# Altium footprint library Connectors.PcbLib: 218 footprints (part 10 of 14)
Each footprint in its own frame and in the unit in brackets; x right, y up, seen from the top. Pads: shape width x height; smd on the part's side, far side on the other; paste and mask are expansions set on the pad; w line width, h text height; cw(c..) or ccw(c..) is an arc to the next point about the centre after c.
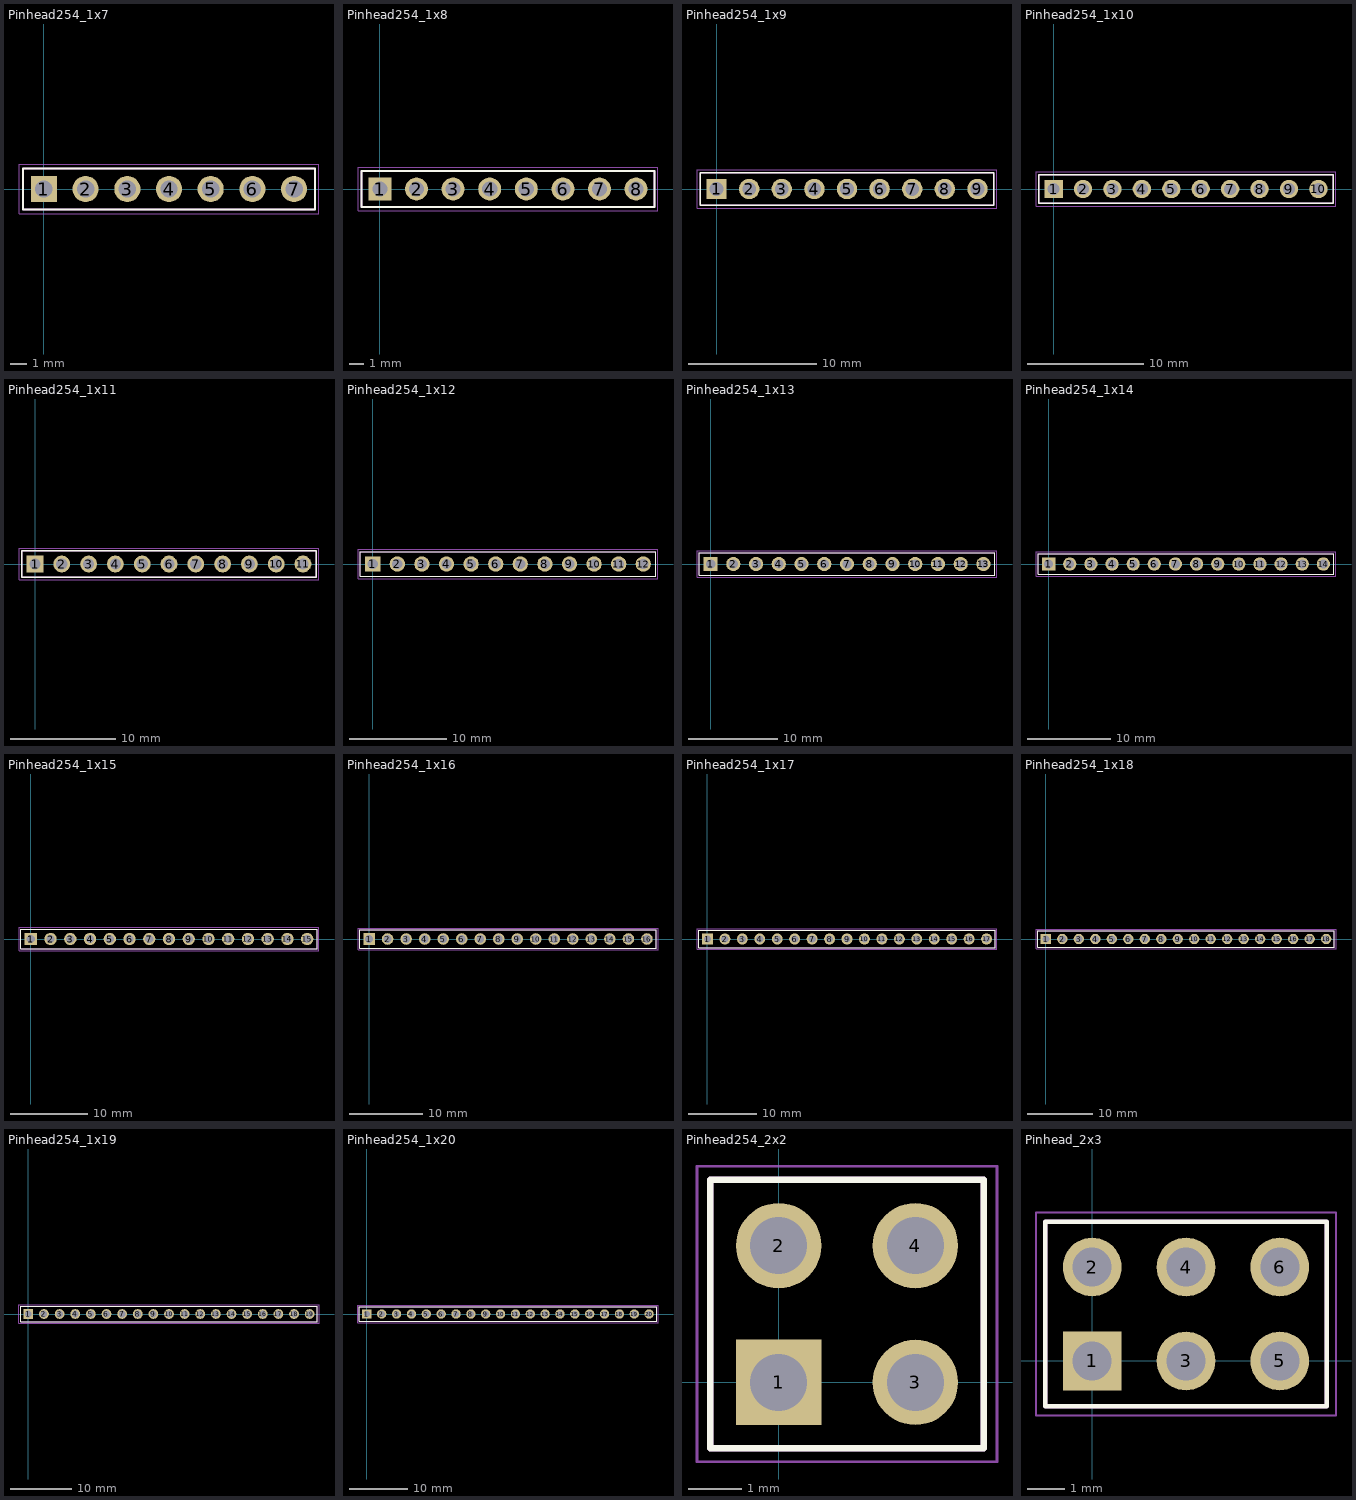
[diagram p9: the footprints below, top view; thin cyan lines are the x and y axes]

## Pinhead254_1x7 [mm]
height 8.79
pads (7):
  rect 1.59x1.59 hole 1.06: 1(0,0)
  round 1.59 hole 1.06: 2(2.54,0) 3(5.08,0) 4(7.62,0) 5(10.16,0) 6(12.7,0) 7(15.24,0)
Top Overlay:
  lines w0.12: -1.27,-1.25 -1.27,1.25 16.51,1.25 16.51,-1.25 -1.27,-1.25
Mechanical 8:
  lines w0.12: -1.27,-1.25 -1.27,1.25 16.51,1.25 16.51,-1.25 -1.27,-1.25
Mechanical 13:
  lines w0.025: -1.27,-1.25 -1.27,1.25 16.51,1.25 16.51,-1.25 -1.27,-1.25 ; -0.32,-0.32 -0.32,0.32 0.32,0.32 0.32,-0.32 -0.32,-0.32 ; 2.22,-0.32 2.22,0.32 2.86,0.32 2.86,-0.32 2.22,-0.32 ; 4.76,-0.32 4.76,0.32 5.4,0.32 5.4,-0.32 4.76,-0.32 ; 7.3,-0.32 7.3,0.32 7.94,0.32 7.94,-0.32 7.3,-0.32 ; 9.84,-0.32 9.84,0.32 10.48,0.32 10.48,-0.32 9.84,-0.32 ; 12.38,-0.32 12.38,0.32 13.02,0.32 13.02,-0.32 12.38,-0.32 ; 14.92,-0.32 14.92,0.32 15.56,0.32 15.56,-0.32 14.92,-0.32
Mechanical 15:
  circle w0.05: c0,0 r0.25
  lines w0.05: -0.35,0 0.35,0 ; 0,-0.35 0,0.35 ; -1.52,-1.5 -1.52,1.5 16.76,1.5 16.76,-1.5 -1.52,-1.5
3D body: height 8.79, standoff -2.3, extent -1.27,-1.25 16.51,1.25

## Pinhead254_1x8 [mm]
height 8.79
pads (8):
  rect 1.59x1.59 hole 1.06: 1(0,0)
  round 1.59 hole 1.06: 2(2.54,0) 3(5.08,0) 4(7.62,0) 5(10.16,0) 6(12.7,0) 7(15.24,0) 8(17.78,0)
Top Overlay:
  lines w0.12: -1.27,-1.25 -1.27,1.25 19.05,1.25 19.05,-1.25 -1.27,-1.25
Mechanical 8:
  lines w0.12: -1.27,-1.25 -1.27,1.25 19.05,1.25 19.05,-1.25 -1.27,-1.25
Mechanical 13:
  lines w0.025: -1.27,-1.25 -1.27,1.25 19.05,1.25 19.05,-1.25 -1.27,-1.25 ; -0.32,-0.32 -0.32,0.32 0.32,0.32 0.32,-0.32 -0.32,-0.32 ; 2.22,-0.32 2.22,0.32 2.86,0.32 2.86,-0.32 2.22,-0.32 ; 4.76,-0.32 4.76,0.32 5.4,0.32 5.4,-0.32 4.76,-0.32 ; 7.3,-0.32 7.3,0.32 7.94,0.32 7.94,-0.32 7.3,-0.32 ; 9.84,-0.32 9.84,0.32 10.48,0.32 10.48,-0.32 9.84,-0.32 ; 12.38,-0.32 12.38,0.32 13.02,0.32 13.02,-0.32 12.38,-0.32 ; 14.92,-0.32 14.92,0.32 15.56,0.32 15.56,-0.32 14.92,-0.32 ; 17.46,-0.32 17.46,0.32 18.1,0.32 18.1,-0.32 17.46,-0.32
Mechanical 15:
  circle w0.05: c0,0 r0.25
  lines w0.05: -0.35,0 0.35,0 ; 0,-0.35 0,0.35 ; -1.52,-1.5 -1.52,1.5 19.3,1.5 19.3,-1.5 -1.52,-1.5
3D body: height 8.79, standoff -2.3, extent -1.27,-1.25 19.05,1.25

## Pinhead254_1x9 [mm]
height 8.79
pads (9):
  rect 1.59x1.59 hole 1.06: 1(0,0)
  round 1.59 hole 1.06: 2(2.54,0) 3(5.08,0) 4(7.62,0) 5(10.16,0) 6(12.7,0) 7(15.24,0) 8(17.78,0) 9(20.32,0)
Top Overlay:
  lines w0.12: -1.27,-1.25 -1.27,1.25 21.59,1.25 21.59,-1.25 -1.27,-1.25
Mechanical 8:
  lines w0.12: -1.27,-1.25 -1.27,1.25 21.59,1.25 21.59,-1.25 -1.27,-1.25
Mechanical 13:
  lines w0.025: -1.27,-1.25 -1.27,1.25 21.59,1.25 21.59,-1.25 -1.27,-1.25 ; -0.32,-0.32 -0.32,0.32 0.32,0.32 0.32,-0.32 -0.32,-0.32 ; 2.22,-0.32 2.22,0.32 2.86,0.32 2.86,-0.32 2.22,-0.32 ; 4.76,-0.32 4.76,0.32 5.4,0.32 5.4,-0.32 4.76,-0.32 ; 7.3,-0.32 7.3,0.32 7.94,0.32 7.94,-0.32 7.3,-0.32 ; 9.84,-0.32 9.84,0.32 10.48,0.32 10.48,-0.32 9.84,-0.32 ; 12.38,-0.32 12.38,0.32 13.02,0.32 13.02,-0.32 12.38,-0.32 ; 14.92,-0.32 14.92,0.32 15.56,0.32 15.56,-0.32 14.92,-0.32 ; 17.46,-0.32 17.46,0.32 18.1,0.32 18.1,-0.32 17.46,-0.32 ; 20,-0.32 20,0.32 20.64,0.32 20.64,-0.32 20,-0.32
Mechanical 15:
  circle w0.05: c0,0 r0.25
  lines w0.05: -0.35,0 0.35,0 ; 0,-0.35 0,0.35 ; -1.52,-1.5 -1.52,1.5 21.84,1.5 21.84,-1.5 -1.52,-1.5
3D body: height 8.79, standoff -2.3, extent -1.27,-1.25 21.59,1.25

## Pinhead254_1x10 [mm]
height 8.79
pads (10):
  rect 1.59x1.59 hole 1.06: 1(0,0)
  round 1.59 hole 1.06: 2(2.54,0) 3(5.08,0) 4(7.62,0) 5(10.16,0) 6(12.7,0) 7(15.24,0) 8(17.78,0) 9(20.32,0) 10(22.86,0)
Top Overlay:
  lines w0.12: -1.27,-1.25 -1.27,1.25 24.13,1.25 24.13,-1.25 -1.27,-1.25
Mechanical 8:
  lines w0.12: -1.27,-1.25 -1.27,1.25 24.13,1.25 24.13,-1.25 -1.27,-1.25
Mechanical 13:
  lines w0.025: -1.27,-1.25 -1.27,1.25 24.13,1.25 24.13,-1.25 -1.27,-1.25 ; -0.32,-0.32 -0.32,0.32 0.32,0.32 0.32,-0.32 -0.32,-0.32 ; 2.22,-0.32 2.22,0.32 2.86,0.32 2.86,-0.32 2.22,-0.32 ; 4.76,-0.32 4.76,0.32 5.4,0.32 5.4,-0.32 4.76,-0.32 ; 7.3,-0.32 7.3,0.32 7.94,0.32 7.94,-0.32 7.3,-0.32 ; 9.84,-0.32 9.84,0.32 10.48,0.32 10.48,-0.32 9.84,-0.32 ; 12.38,-0.32 12.38,0.32 13.02,0.32 13.02,-0.32 12.38,-0.32 ; 14.92,-0.32 14.92,0.32 15.56,0.32 15.56,-0.32 14.92,-0.32 ; 17.46,-0.32 17.46,0.32 18.1,0.32 18.1,-0.32 17.46,-0.32 ; 20,-0.32 20,0.32 20.64,0.32 20.64,-0.32 20,-0.32 ; 22.54,-0.32 22.54,0.32 23.18,0.32 23.18,-0.32 22.54,-0.32
Mechanical 15:
  circle w0.05: c0,0 r0.25
  lines w0.05: -0.35,0 0.35,0 ; 0,-0.35 0,0.35 ; -1.52,-1.5 -1.52,1.5 24.38,1.5 24.38,-1.5 -1.52,-1.5
3D body: height 8.79, standoff -2.3, extent -1.27,-1.25 24.13,1.25

## Pinhead254_1x11 [mm]
height 8.79
pads (11):
  rect 1.59x1.59 hole 1.06: 1(0,0)
  round 1.59 hole 1.06: 2(2.54,0) 3(5.08,0) 4(7.62,0) 5(10.16,0) 6(12.7,0) 7(15.24,0) 8(17.78,0) 9(20.32,0) 10(22.86,0) 11(25.4,0)
Top Overlay:
  lines w0.12: -1.27,-1.25 -1.27,1.25 26.67,1.25 26.67,-1.25 -1.27,-1.25
Mechanical 8:
  lines w0.12: -1.27,-1.25 -1.27,1.25 26.67,1.25 26.67,-1.25 -1.27,-1.25
Mechanical 13:
  lines w0.025: -1.27,-1.25 -1.27,1.25 26.67,1.25 26.67,-1.25 -1.27,-1.25 ; -0.32,-0.32 -0.32,0.32 0.32,0.32 0.32,-0.32 -0.32,-0.32 ; 2.22,-0.32 2.22,0.32 2.86,0.32 2.86,-0.32 2.22,-0.32 ; 4.76,-0.32 4.76,0.32 5.4,0.32 5.4,-0.32 4.76,-0.32 ; 7.3,-0.32 7.3,0.32 7.94,0.32 7.94,-0.32 7.3,-0.32 ; 9.84,-0.32 9.84,0.32 10.48,0.32 10.48,-0.32 9.84,-0.32 ; 12.38,-0.32 12.38,0.32 13.02,0.32 13.02,-0.32 12.38,-0.32 ; 14.92,-0.32 14.92,0.32 15.56,0.32 15.56,-0.32 14.92,-0.32 ; 17.46,-0.32 17.46,0.32 18.1,0.32 18.1,-0.32 17.46,-0.32 ; 20,-0.32 20,0.32 20.64,0.32 20.64,-0.32 20,-0.32 ; 22.54,-0.32 22.54,0.32 23.18,0.32 23.18,-0.32 22.54,-0.32 ; 25.08,-0.32 25.08,0.32 25.72,0.32 25.72,-0.32 25.08,-0.32
Mechanical 15:
  circle w0.05: c0,0 r0.25
  lines w0.05: -0.35,0 0.35,0 ; 0,-0.35 0,0.35 ; -1.52,-1.5 -1.52,1.5 26.92,1.5 26.92,-1.5 -1.52,-1.5
3D body: height 8.79, standoff -2.3, extent -1.27,-1.25 26.67,1.25

## Pinhead254_1x12 [mm]
height 8.79
pads (12):
  rect 1.59x1.59 hole 1.06: 1(0,0)
  round 1.59 hole 1.06: 2(2.54,0) 3(5.08,0) 4(7.62,0) 5(10.16,0) 6(12.7,0) 7(15.24,0) 8(17.78,0) 9(20.32,0) 10(22.86,0) 11(25.4,0) 12(27.94,0)
Top Overlay:
  lines w0.12: -1.27,-1.25 29.21,-1.25 29.21,1.25 -1.27,1.25 -1.27,-1.25
Mechanical 8:
  lines w0.12: -1.27,-1.25 29.21,-1.25 29.21,1.25 -1.27,1.25 -1.27,-1.25
Mechanical 13:
  lines w0.025: -1.27,-1.25 29.21,-1.25 29.21,1.25 -1.27,1.25 -1.27,-1.25 ; -0.32,-0.32 0.32,-0.32 0.32,0.32 -0.32,0.32 -0.32,-0.32 ; 2.22,-0.32 2.86,-0.32 2.86,0.32 2.22,0.32 2.22,-0.32 ; 4.76,-0.32 5.4,-0.32 5.4,0.32 4.76,0.32 4.76,-0.32 ; 7.3,-0.32 7.94,-0.32 7.94,0.32 7.3,0.32 7.3,-0.32 ; 9.84,-0.32 10.48,-0.32 10.48,0.32 9.84,0.32 9.84,-0.32 ; 12.38,-0.32 13.02,-0.32 13.02,0.32 12.38,0.32 12.38,-0.32 ; 14.92,-0.32 15.56,-0.32 15.56,0.32 14.92,0.32 14.92,-0.32 ; 17.46,-0.32 18.1,-0.32 18.1,0.32 17.46,0.32 17.46,-0.32 ; 20,-0.32 20.64,-0.32 20.64,0.32 20,0.32 20,-0.32 ; 22.54,-0.32 23.18,-0.32 23.18,0.32 22.54,0.32 22.54,-0.32 ; 25.08,-0.32 25.72,-0.32 25.72,0.32 25.08,0.32 25.08,-0.32 ; 27.62,-0.32 28.26,-0.32 28.26,0.32 27.62,0.32 27.62,-0.32
Mechanical 15:
  circle w0.05: c0,0 r0.25
  lines w0.05: -0.35,0 0.35,0 ; 0,-0.35 0,0.35 ; -1.52,-1.5 29.46,-1.5 29.46,1.5 -1.52,1.5 -1.52,-1.5
3D body: height 8.79, standoff -2.3, extent -1.27,-1.25 29.21,1.25

## Pinhead254_1x13 [mm]
height 8.79
pads (13):
  rect 1.59x1.59 hole 1.06: 1(0,0)
  round 1.59 hole 1.06: 2(2.54,0) 3(5.08,0) 4(7.62,0) 5(10.16,0) 6(12.7,0) 7(15.24,0) 8(17.78,0) 9(20.32,0) 10(22.86,0) 11(25.4,0) 12(27.94,0) 13(30.48,0)
Top Overlay:
  lines w0.12: -1.27,-1.25 -1.27,1.25 31.75,1.25 31.75,-1.25 -1.27,-1.25
Mechanical 8:
  lines w0.12: -1.27,-1.25 -1.27,1.25 31.75,1.25 31.75,-1.25 -1.27,-1.25
Mechanical 13:
  lines w0.025: -1.27,-1.25 -1.27,1.25 31.75,1.25 31.75,-1.25 -1.27,-1.25 ; -0.32,-0.32 -0.32,0.32 0.32,0.32 0.32,-0.32 -0.32,-0.32 ; 2.22,-0.32 2.22,0.32 2.86,0.32 2.86,-0.32 2.22,-0.32 ; 4.76,-0.32 4.76,0.32 5.4,0.32 5.4,-0.32 4.76,-0.32 ; 7.3,-0.32 7.3,0.32 7.94,0.32 7.94,-0.32 7.3,-0.32 ; 9.84,-0.32 9.84,0.32 10.48,0.32 10.48,-0.32 9.84,-0.32 ; 12.38,-0.32 12.38,0.32 13.02,0.32 13.02,-0.32 12.38,-0.32 ; 14.92,-0.32 14.92,0.32 15.56,0.32 15.56,-0.32 14.92,-0.32 ; 17.46,-0.32 17.46,0.32 18.1,0.32 18.1,-0.32 17.46,-0.32 ; 20,-0.32 20,0.32 20.64,0.32 20.64,-0.32 20,-0.32 ; 22.54,-0.32 22.54,0.32 23.18,0.32 23.18,-0.32 22.54,-0.32 ; 25.08,-0.32 25.08,0.32 25.72,0.32 25.72,-0.32 25.08,-0.32 ; 27.62,-0.32 27.62,0.32 28.26,0.32 28.26,-0.32 27.62,-0.32 ; 30.16,-0.32 30.16,0.32 30.8,0.32 30.8,-0.32 30.16,-0.32
Mechanical 15:
  circle w0.05: c0,0 r0.25
  lines w0.05: -0.35,0 0.35,0 ; 0,-0.35 0,0.35 ; -1.52,-1.5 -1.52,1.5 32,1.5 32,-1.5 -1.52,-1.5
3D body: height 8.79, standoff -2.3, extent -1.27,-1.25 31.75,1.25

## Pinhead254_1x14 [mm]
height 8.79
pads (14):
  rect 1.59x1.59 hole 1.06: 1(0,0)
  round 1.59 hole 1.06: 2(2.54,0) 3(5.08,0) 4(7.62,0) 5(10.16,0) 6(12.7,0) 7(15.24,0) 8(17.78,0) 9(20.32,0) 10(22.86,0) 11(25.4,0) 12(27.94,0) 13(30.48,0) 14(33.02,0)
Top Overlay:
  lines w0.12: -1.27,-1.25 -1.27,1.25 34.29,1.25 34.29,-1.25 -1.27,-1.25
Mechanical 8:
  lines w0.12: -1.27,-1.25 -1.27,1.25 34.29,1.25 34.29,-1.25 -1.27,-1.25
Mechanical 13:
  lines w0.025: -1.27,-1.25 -1.27,1.25 34.29,1.25 34.29,-1.25 -1.27,-1.25 ; -0.32,-0.32 -0.32,0.32 0.32,0.32 0.32,-0.32 -0.32,-0.32 ; 2.22,-0.32 2.22,0.32 2.86,0.32 2.86,-0.32 2.22,-0.32 ; 4.76,-0.32 4.76,0.32 5.4,0.32 5.4,-0.32 4.76,-0.32 ; 7.3,-0.32 7.3,0.32 7.94,0.32 7.94,-0.32 7.3,-0.32 ; 9.84,-0.32 9.84,0.32 10.48,0.32 10.48,-0.32 9.84,-0.32 ; 12.38,-0.32 12.38,0.32 13.02,0.32 13.02,-0.32 12.38,-0.32 ; 14.92,-0.32 14.92,0.32 15.56,0.32 15.56,-0.32 14.92,-0.32 ; 17.46,-0.32 17.46,0.32 18.1,0.32 18.1,-0.32 17.46,-0.32 ; 20,-0.32 20,0.32 20.64,0.32 20.64,-0.32 20,-0.32 ; 22.54,-0.32 22.54,0.32 23.18,0.32 23.18,-0.32 22.54,-0.32 ; 25.08,-0.32 25.08,0.32 25.72,0.32 25.72,-0.32 25.08,-0.32 ; 27.62,-0.32 27.62,0.32 28.26,0.32 28.26,-0.32 27.62,-0.32 ; 30.16,-0.32 30.16,0.32 30.8,0.32 30.8,-0.32 30.16,-0.32 ; 32.7,-0.32 32.7,0.32 33.34,0.32 33.34,-0.32 32.7,-0.32
Mechanical 15:
  circle w0.05: c0,0 r0.25
  lines w0.05: -0.35,0 0.35,0 ; 0,-0.35 0,0.35 ; -1.52,-1.5 -1.52,1.5 34.54,1.5 34.54,-1.5 -1.52,-1.5
3D body: height 8.79, standoff -2.3, extent -1.27,-1.25 34.29,1.25

## Pinhead254_1x15 [mm]
height 8.79
pads (15):
  rect 1.59x1.59 hole 1.06: 1(0,0)
  round 1.59 hole 1.06: 2(2.54,0) 3(5.08,0) 4(7.62,0) 5(10.16,0) 6(12.7,0) 7(15.24,0) 8(17.78,0) 9(20.32,0) 10(22.86,0) 11(25.4,0) 12(27.94,0) 13(30.48,0) 14(33.02,0) 15(35.56,0)
Top Overlay:
  lines w0.12: -1.27,-1.25 -1.27,1.25 36.83,1.25 36.83,-1.25 -1.27,-1.25
Mechanical 8:
  lines w0.12: -1.27,-1.25 -1.27,1.25 36.83,1.25 36.83,-1.25 -1.27,-1.25
Mechanical 13:
  lines w0.025: -1.27,-1.25 -1.27,1.25 36.83,1.25 36.83,-1.25 -1.27,-1.25 ; -0.32,-0.32 -0.32,0.32 0.32,0.32 0.32,-0.32 -0.32,-0.32 ; 2.22,-0.32 2.22,0.32 2.86,0.32 2.86,-0.32 2.22,-0.32 ; 4.76,-0.32 4.76,0.32 5.4,0.32 5.4,-0.32 4.76,-0.32 ; 7.3,-0.32 7.3,0.32 7.94,0.32 7.94,-0.32 7.3,-0.32 ; 9.84,-0.32 9.84,0.32 10.48,0.32 10.48,-0.32 9.84,-0.32 ; 12.38,-0.32 12.38,0.32 13.02,0.32 13.02,-0.32 12.38,-0.32 ; 14.92,-0.32 14.92,0.32 15.56,0.32 15.56,-0.32 14.92,-0.32 ; 17.46,-0.32 17.46,0.32 18.1,0.32 18.1,-0.32 17.46,-0.32 ; 20,-0.32 20,0.32 20.64,0.32 20.64,-0.32 20,-0.32 ; 22.54,-0.32 22.54,0.32 23.18,0.32 23.18,-0.32 22.54,-0.32 ; 25.08,-0.32 25.08,0.32 25.72,0.32 25.72,-0.32 25.08,-0.32 ; 27.62,-0.32 27.62,0.32 28.26,0.32 28.26,-0.32 27.62,-0.32 ; 30.16,-0.32 30.16,0.32 30.8,0.32 30.8,-0.32 30.16,-0.32 ; 32.7,-0.32 32.7,0.32 33.34,0.32 33.34,-0.32 32.7,-0.32 ; 35.24,-0.32 35.24,0.32 35.88,0.32 35.88,-0.32 35.24,-0.32
Mechanical 15:
  circle w0.05: c0,0 r0.25
  lines w0.05: -0.35,0 0.35,0 ; 0,-0.35 0,0.35 ; -1.52,-1.5 -1.52,1.5 37.08,1.5 37.08,-1.5 -1.52,-1.5
3D body: height 8.79, standoff -2.3, extent -1.27,-1.25 36.83,1.25

## Pinhead254_1x16 [mm]
height 8.79
pads (16):
  rect 1.59x1.59 hole 1.06: 1(0,0)
  round 1.59 hole 1.06: 2(2.54,0) 3(5.08,0) 4(7.62,0) 5(10.16,0) 6(12.7,0) 7(15.24,0) 8(17.78,0) 9(20.32,0) 10(22.86,0) 11(25.4,0) 12(27.94,0) 13(30.48,0) 14(33.02,0) 15(35.56,0) 16(38.1,0)
Top Overlay:
  lines w0.12: -1.27,-1.25 -1.27,1.25 39.37,1.25 39.37,-1.25 -1.27,-1.25
Mechanical 8:
  lines w0.12: -1.27,-1.25 -1.27,1.25 39.37,1.25 39.37,-1.25 -1.27,-1.25
Mechanical 13:
  lines w0.025: -1.27,-1.25 -1.27,1.25 39.37,1.25 39.37,-1.25 -1.27,-1.25 ; -0.32,-0.32 -0.32,0.32 0.32,0.32 0.32,-0.32 -0.32,-0.32 ; 2.22,-0.32 2.22,0.32 2.86,0.32 2.86,-0.32 2.22,-0.32 ; 4.76,-0.32 4.76,0.32 5.4,0.32 5.4,-0.32 4.76,-0.32 ; 7.3,-0.32 7.3,0.32 7.94,0.32 7.94,-0.32 7.3,-0.32 ; 9.84,-0.32 9.84,0.32 10.48,0.32 10.48,-0.32 9.84,-0.32 ; 12.38,-0.32 12.38,0.32 13.02,0.32 13.02,-0.32 12.38,-0.32 ; 14.92,-0.32 14.92,0.32 15.56,0.32 15.56,-0.32 14.92,-0.32 ; 17.46,-0.32 17.46,0.32 18.1,0.32 18.1,-0.32 17.46,-0.32 ; 20,-0.32 20,0.32 20.64,0.32 20.64,-0.32 20,-0.32 ; 22.54,-0.32 22.54,0.32 23.18,0.32 23.18,-0.32 22.54,-0.32 ; 25.08,-0.32 25.08,0.32 25.72,0.32 25.72,-0.32 25.08,-0.32 ; 27.62,-0.32 27.62,0.32 28.26,0.32 28.26,-0.32 27.62,-0.32 ; 30.16,-0.32 30.16,0.32 30.8,0.32 30.8,-0.32 30.16,-0.32 ; 32.7,-0.32 32.7,0.32 33.34,0.32 33.34,-0.32 32.7,-0.32 ; 35.24,-0.32 35.24,0.32 35.88,0.32 35.88,-0.32 35.24,-0.32 ; 37.78,-0.32 37.78,0.32 38.42,0.32 38.42,-0.32 37.78,-0.32
Mechanical 15:
  circle w0.05: c0,0 r0.25
  lines w0.05: -0.35,0 0.35,0 ; 0,-0.35 0,0.35 ; -1.52,-1.5 -1.52,1.5 39.62,1.5 39.62,-1.5 -1.52,-1.5
3D body: height 8.79, standoff -2.3, extent -1.27,-1.25 39.37,1.25

## Pinhead254_1x17 [mm]
height 8.79
pads (17):
  rect 1.59x1.59 hole 1.06: 1(0,0)
  round 1.59 hole 1.06: 2(2.54,0) 3(5.08,0) 4(7.62,0) 5(10.16,0) 6(12.7,0) 7(15.24,0) 8(17.78,0) 9(20.32,0) 10(22.86,0) 11(25.4,0) 12(27.94,0) 13(30.48,0) 14(33.02,0) 15(35.56,0) 16(38.1,0) 17(40.64,0)
Top Overlay:
  lines w0.12: -1.27,-1.25 41.91,-1.25 41.91,1.25 -1.27,1.25 -1.27,-1.25
Mechanical 8:
  lines w0.12: -1.27,-1.25 41.91,-1.25 41.91,1.25 -1.27,1.25 -1.27,-1.25
Mechanical 13:
  lines w0.025: -1.27,-1.25 41.91,-1.25 41.91,1.25 -1.27,1.25 -1.27,-1.25 ; -0.32,-0.32 0.32,-0.32 0.32,0.32 -0.32,0.32 -0.32,-0.32 ; 2.22,-0.32 2.86,-0.32 2.86,0.32 2.22,0.32 2.22,-0.32 ; 4.76,-0.32 5.4,-0.32 5.4,0.32 4.76,0.32 4.76,-0.32 ; 7.3,-0.32 7.94,-0.32 7.94,0.32 7.3,0.32 7.3,-0.32 ; 9.84,-0.32 10.48,-0.32 10.48,0.32 9.84,0.32 9.84,-0.32 ; 12.38,-0.32 13.02,-0.32 13.02,0.32 12.38,0.32 12.38,-0.32 ; 14.92,-0.32 15.56,-0.32 15.56,0.32 14.92,0.32 14.92,-0.32 ; 17.46,-0.32 18.1,-0.32 18.1,0.32 17.46,0.32 17.46,-0.32 ; 20,-0.32 20.64,-0.32 20.64,0.32 20,0.32 20,-0.32 ; 22.54,-0.32 23.18,-0.32 23.18,0.32 22.54,0.32 22.54,-0.32 ; 25.08,-0.32 25.72,-0.32 25.72,0.32 25.08,0.32 25.08,-0.32 ; 27.62,-0.32 28.26,-0.32 28.26,0.32 27.62,0.32 27.62,-0.32 ; 30.16,-0.32 30.8,-0.32 30.8,0.32 30.16,0.32 30.16,-0.32 ; 32.7,-0.32 33.34,-0.32 33.34,0.32 32.7,0.32 32.7,-0.32 ; 35.24,-0.32 35.88,-0.32 35.88,0.32 35.24,0.32 35.24,-0.32 ; 37.78,-0.32 38.42,-0.32 38.42,0.32 37.78,0.32 37.78,-0.32 ; 40.32,-0.32 40.96,-0.32 40.96,0.32 40.32,0.32 40.32,-0.32
Mechanical 15:
  circle w0.05: c0,0 r0.25
  lines w0.05: -0.35,0 0.35,0 ; 0,-0.35 0,0.35 ; -1.52,-1.5 42.16,-1.5 42.16,1.5 -1.52,1.5 -1.52,-1.5
3D body: height 8.79, standoff -2.3, extent -1.27,-1.25 41.91,1.25

## Pinhead254_1x18 [mm]
height 8.79
pads (18):
  rect 1.59x1.59 hole 1.06: 1(0,0)
  round 1.59 hole 1.06: 2(2.54,0) 3(5.08,0) 4(7.62,0) 5(10.16,0) 6(12.7,0) 7(15.24,0) 8(17.78,0) 9(20.32,0) 10(22.86,0) 11(25.4,0) 12(27.94,0) 13(30.48,0) 14(33.02,0) 15(35.56,0) 16(38.1,0) 17(40.64,0) 18(43.18,0)
Top Overlay:
  lines w0.12: -1.27,-1.25 44.45,-1.25 44.45,1.25 -1.27,1.25 -1.27,-1.25
Mechanical 8:
  lines w0.12: -1.27,-1.25 44.45,-1.25 44.45,1.25 -1.27,1.25 -1.27,-1.25
Mechanical 13:
  lines w0.025: -1.27,-1.25 44.45,-1.25 44.45,1.25 -1.27,1.25 -1.27,-1.25 ; -0.32,-0.32 0.32,-0.32 0.32,0.32 -0.32,0.32 -0.32,-0.32 ; 2.22,-0.32 2.86,-0.32 2.86,0.32 2.22,0.32 2.22,-0.32 ; 4.76,-0.32 5.4,-0.32 5.4,0.32 4.76,0.32 4.76,-0.32 ; 7.3,-0.32 7.94,-0.32 7.94,0.32 7.3,0.32 7.3,-0.32 ; 9.84,-0.32 10.48,-0.32 10.48,0.32 9.84,0.32 9.84,-0.32 ; 12.38,-0.32 13.02,-0.32 13.02,0.32 12.38,0.32 12.38,-0.32 ; 14.92,-0.32 15.56,-0.32 15.56,0.32 14.92,0.32 14.92,-0.32 ; 17.46,-0.32 18.1,-0.32 18.1,0.32 17.46,0.32 17.46,-0.32 ; 20,-0.32 20.64,-0.32 20.64,0.32 20,0.32 20,-0.32 ; 22.54,-0.32 23.18,-0.32 23.18,0.32 22.54,0.32 22.54,-0.32 ; 25.08,-0.32 25.72,-0.32 25.72,0.32 25.08,0.32 25.08,-0.32 ; 27.62,-0.32 28.26,-0.32 28.26,0.32 27.62,0.32 27.62,-0.32 ; 30.16,-0.32 30.8,-0.32 30.8,0.32 30.16,0.32 30.16,-0.32 ; 32.7,-0.32 33.34,-0.32 33.34,0.32 32.7,0.32 32.7,-0.32 ; 35.24,-0.32 35.88,-0.32 35.88,0.32 35.24,0.32 35.24,-0.32 ; 37.78,-0.32 38.42,-0.32 38.42,0.32 37.78,0.32 37.78,-0.32 ; 40.32,-0.32 40.96,-0.32 40.96,0.32 40.32,0.32 40.32,-0.32 ; 42.86,-0.32 43.5,-0.32 43.5,0.32 42.86,0.32 42.86,-0.32
Mechanical 15:
  circle w0.05: c0,0 r0.25
  lines w0.05: -0.35,0 0.35,0 ; 0,-0.35 0,0.35 ; -1.52,-1.5 44.7,-1.5 44.7,1.5 -1.52,1.5 -1.52,-1.5
3D body: height 8.79, standoff -2.3, extent -1.27,-1.25 44.45,1.25

## Pinhead254_1x19 [mm]
height 8.79
pads (19):
  rect 1.59x1.59 hole 1.06: 1(0,0)
  round 1.59 hole 1.06: 2(2.54,0) 3(5.08,0) 4(7.62,0) 5(10.16,0) 6(12.7,0) 7(15.24,0) 8(17.78,0) 9(20.32,0) 10(22.86,0) 11(25.4,0) 12(27.94,0) 13(30.48,0) 14(33.02,0) 15(35.56,0) 16(38.1,0) 17(40.64,0) 18(43.18,0) 19(45.72,0)
Top Overlay:
  lines w0.12: -1.27,-1.25 -1.27,1.25 46.99,1.25 46.99,-1.25 -1.27,-1.25
Mechanical 8:
  lines w0.12: -1.27,-1.25 -1.27,1.25 46.99,1.25 46.99,-1.25 -1.27,-1.25
Mechanical 13:
  lines w0.025: -1.27,-1.25 -1.27,1.25 46.99,1.25 46.99,-1.25 -1.27,-1.25 ; -0.32,-0.32 -0.32,0.32 0.32,0.32 0.32,-0.32 -0.32,-0.32 ; 2.22,-0.32 2.22,0.32 2.86,0.32 2.86,-0.32 2.22,-0.32 ; 4.76,-0.32 4.76,0.32 5.4,0.32 5.4,-0.32 4.76,-0.32 ; 7.3,-0.32 7.3,0.32 7.94,0.32 7.94,-0.32 7.3,-0.32 ; 9.84,-0.32 9.84,0.32 10.48,0.32 10.48,-0.32 9.84,-0.32 ; 12.38,-0.32 12.38,0.32 13.02,0.32 13.02,-0.32 12.38,-0.32 ; 14.92,-0.32 14.92,0.32 15.56,0.32 15.56,-0.32 14.92,-0.32 ; 17.46,-0.32 17.46,0.32 18.1,0.32 18.1,-0.32 17.46,-0.32 ; 20,-0.32 20,0.32 20.64,0.32 20.64,-0.32 20,-0.32 ; 22.54,-0.32 22.54,0.32 23.18,0.32 23.18,-0.32 22.54,-0.32 ; 25.08,-0.32 25.08,0.32 25.72,0.32 25.72,-0.32 25.08,-0.32 ; 27.62,-0.32 27.62,0.32 28.26,0.32 28.26,-0.32 27.62,-0.32 ; 30.16,-0.32 30.16,0.32 30.8,0.32 30.8,-0.32 30.16,-0.32 ; 32.7,-0.32 32.7,0.32 33.34,0.32 33.34,-0.32 32.7,-0.32 ; 35.24,-0.32 35.24,0.32 35.88,0.32 35.88,-0.32 35.24,-0.32 ; 37.78,-0.32 37.78,0.32 38.42,0.32 38.42,-0.32 37.78,-0.32 ; 40.32,-0.32 40.32,0.32 40.96,0.32 40.96,-0.32 40.32,-0.32 ; 42.86,-0.32 42.86,0.32 43.5,0.32 43.5,-0.32 42.86,-0.32 ; 45.4,-0.32 45.4,0.32 46.04,0.32 46.04,-0.32 45.4,-0.32
Mechanical 15:
  circle w0.05: c0,0 r0.25
  lines w0.05: -0.35,0 0.35,0 ; 0,-0.35 0,0.35 ; -1.52,-1.5 -1.52,1.5 47.24,1.5 47.24,-1.5 -1.52,-1.5
3D body: height 8.79, standoff -2.3, extent -1.27,-1.25 46.99,1.25

## Pinhead254_1x20 [mm]
height 8.79
pads (20):
  rect 1.59x1.59 hole 1.06: 1(0,0)
  round 1.59 hole 1.06: 2(2.54,0) 3(5.08,0) 4(7.62,0) 5(10.16,0) 6(12.7,0) 7(15.24,0) 8(17.78,0) 9(20.32,0) 10(22.86,0) 11(25.4,0) 12(27.94,0) 13(30.48,0) 14(33.02,0) 15(35.56,0) 16(38.1,0) 17(40.64,0) 18(43.18,0) 19(45.72,0) 20(48.26,0)
Top Overlay:
  lines w0.12: -1.27,-1.25 -1.27,1.25 49.53,1.25 49.53,-1.25 -1.27,-1.25
Mechanical 8:
  lines w0.12: -1.27,-1.25 -1.27,1.25 49.53,1.25 49.53,-1.25 -1.27,-1.25
Mechanical 13:
  lines w0.025: -1.27,-1.25 -1.27,1.25 49.53,1.25 49.53,-1.25 -1.27,-1.25 ; -0.32,-0.32 -0.32,0.32 0.32,0.32 0.32,-0.32 -0.32,-0.32 ; 2.22,-0.32 2.22,0.32 2.86,0.32 2.86,-0.32 2.22,-0.32 ; 4.76,-0.32 4.76,0.32 5.4,0.32 5.4,-0.32 4.76,-0.32 ; 7.3,-0.32 7.3,0.32 7.94,0.32 7.94,-0.32 7.3,-0.32 ; 9.84,-0.32 9.84,0.32 10.48,0.32 10.48,-0.32 9.84,-0.32 ; 12.38,-0.32 12.38,0.32 13.02,0.32 13.02,-0.32 12.38,-0.32 ; 14.92,-0.32 14.92,0.32 15.56,0.32 15.56,-0.32 14.92,-0.32 ; 17.46,-0.32 17.46,0.32 18.1,0.32 18.1,-0.32 17.46,-0.32 ; 20,-0.32 20,0.32 20.64,0.32 20.64,-0.32 20,-0.32 ; 22.54,-0.32 22.54,0.32 23.18,0.32 23.18,-0.32 22.54,-0.32 ; 25.08,-0.32 25.08,0.32 25.72,0.32 25.72,-0.32 25.08,-0.32 ; 27.62,-0.32 27.62,0.32 28.26,0.32 28.26,-0.32 27.62,-0.32 ; 30.16,-0.32 30.16,0.32 30.8,0.32 30.8,-0.32 30.16,-0.32 ; 32.7,-0.32 32.7,0.32 33.34,0.32 33.34,-0.32 32.7,-0.32 ; 35.24,-0.32 35.24,0.32 35.88,0.32 35.88,-0.32 35.24,-0.32 ; 37.78,-0.32 37.78,0.32 38.42,0.32 38.42,-0.32 37.78,-0.32 ; 40.32,-0.32 40.32,0.32 40.96,0.32 40.96,-0.32 40.32,-0.32 ; 42.86,-0.32 42.86,0.32 43.5,0.32 43.5,-0.32 42.86,-0.32 ; 45.4,-0.32 45.4,0.32 46.04,0.32 46.04,-0.32 45.4,-0.32 ; 47.94,-0.32 47.94,0.32 48.58,0.32 48.58,-0.32 47.94,-0.32
Mechanical 15:
  circle w0.05: c0,0 r0.25
  lines w0.05: -0.35,0 0.35,0 ; 0,-0.35 0,0.35 ; -1.52,-1.5 -1.52,1.5 49.78,1.5 49.78,-1.5 -1.52,-1.5
3D body: height 8.79, standoff -2.3, extent -1.27,-1.25 49.53,1.25

## Pinhead254_2x2 [mm]
height 8.79
pads (4):
  rect 1.59x1.59 hole 1.06: 1(0,0)
  round 1.59 hole 1.06: 2(0,2.54) 3(2.54,0) 4(2.54,2.54)
Top Overlay:
  lines w0.12: -1.27,-1.23 -1.27,3.77 3.81,3.77 3.81,-1.23 -1.27,-1.23
Mechanical 8:
  lines w0.12: -1.27,-1.23 -1.27,3.77 3.81,3.77 3.81,-1.23 -1.27,-1.23
Mechanical 13:
  lines w0.025: -1.27,-1.23 -1.27,3.77 3.81,3.77 3.81,-1.23 -1.27,-1.23 ; -0.32,-0.32 -0.32,0.32 0.32,0.32 0.32,-0.32 -0.32,-0.32 ; -0.32,2.22 -0.32,2.86 0.32,2.86 0.32,2.22 -0.32,2.22 ; 2.22,-0.32 2.22,0.32 2.86,0.32 2.86,-0.32 2.22,-0.32 ; 2.22,2.22 2.22,2.86 2.86,2.86 2.86,2.22 2.22,2.22
Mechanical 15:
  circle w0.05: c0,0 r0.25
  lines w0.05: -0.35,0 0.35,0 ; 0,-0.35 0,0.35 ; -1.52,-1.48 -1.52,4.02 4.06,4.02 4.06,-1.48 -1.52,-1.48
3D body: height 8.79, standoff -2.3, extent -1.27,-1.23 3.81,3.77

## Pinhead_2x3 [mm]
height 8.79
pads (6):
  rect 1.59x1.59 hole 1.06: 1(0,0)
  round 1.59 hole 1.06: 2(0,2.54) 3(2.54,0) 4(2.54,2.54) 5(5.08,0) 6(5.08,2.54)
Top Overlay:
  lines w0.12: -1.27,-1.23 6.35,-1.23 6.35,3.77 -1.27,3.77 -1.27,-1.23
Mechanical 8:
  lines w0.12: -1.27,-1.23 6.35,-1.23 6.35,3.77 -1.27,3.77 -1.27,-1.23
Mechanical 13:
  lines w0.025: -1.27,-1.23 6.35,-1.23 6.35,3.77 -1.27,3.77 -1.27,-1.23 ; -0.32,-0.32 0.32,-0.32 0.32,0.32 -0.32,0.32 -0.32,-0.32 ; -0.32,2.22 0.32,2.22 0.32,2.86 -0.32,2.86 -0.32,2.22 ; 2.22,-0.32 2.86,-0.32 2.86,0.32 2.22,0.32 2.22,-0.32 ; 2.22,2.22 2.86,2.22 2.86,2.86 2.22,2.86 2.22,2.22 ; 4.76,-0.32 5.4,-0.32 5.4,0.32 4.76,0.32 4.76,-0.32 ; 4.76,2.22 5.4,2.22 5.4,2.86 4.76,2.86 4.76,2.22
Mechanical 15:
  circle w0.05: c0,0 r0.25
  lines w0.05: -0.35,0 0.35,0 ; 0,-0.35 0,0.35 ; -1.52,-1.48 6.6,-1.48 6.6,4.02 -1.52,4.02 -1.52,-1.48
3D body: height 8.79, standoff -2.3, extent -1.27,-1.23 6.35,3.77